# Altium footprint library standard.PcbLib: 330 footprints (part 21 of 21)
Each footprint in its own frame and in the unit in brackets; x right, y up, seen from the top. Pads: shape width x height; smd on the part's side, far side on the other; paste and mask are expansions set on the pad; w line width, h text height; cw(c..) or ccw(c..) is an arc to the next point about the centre after c.
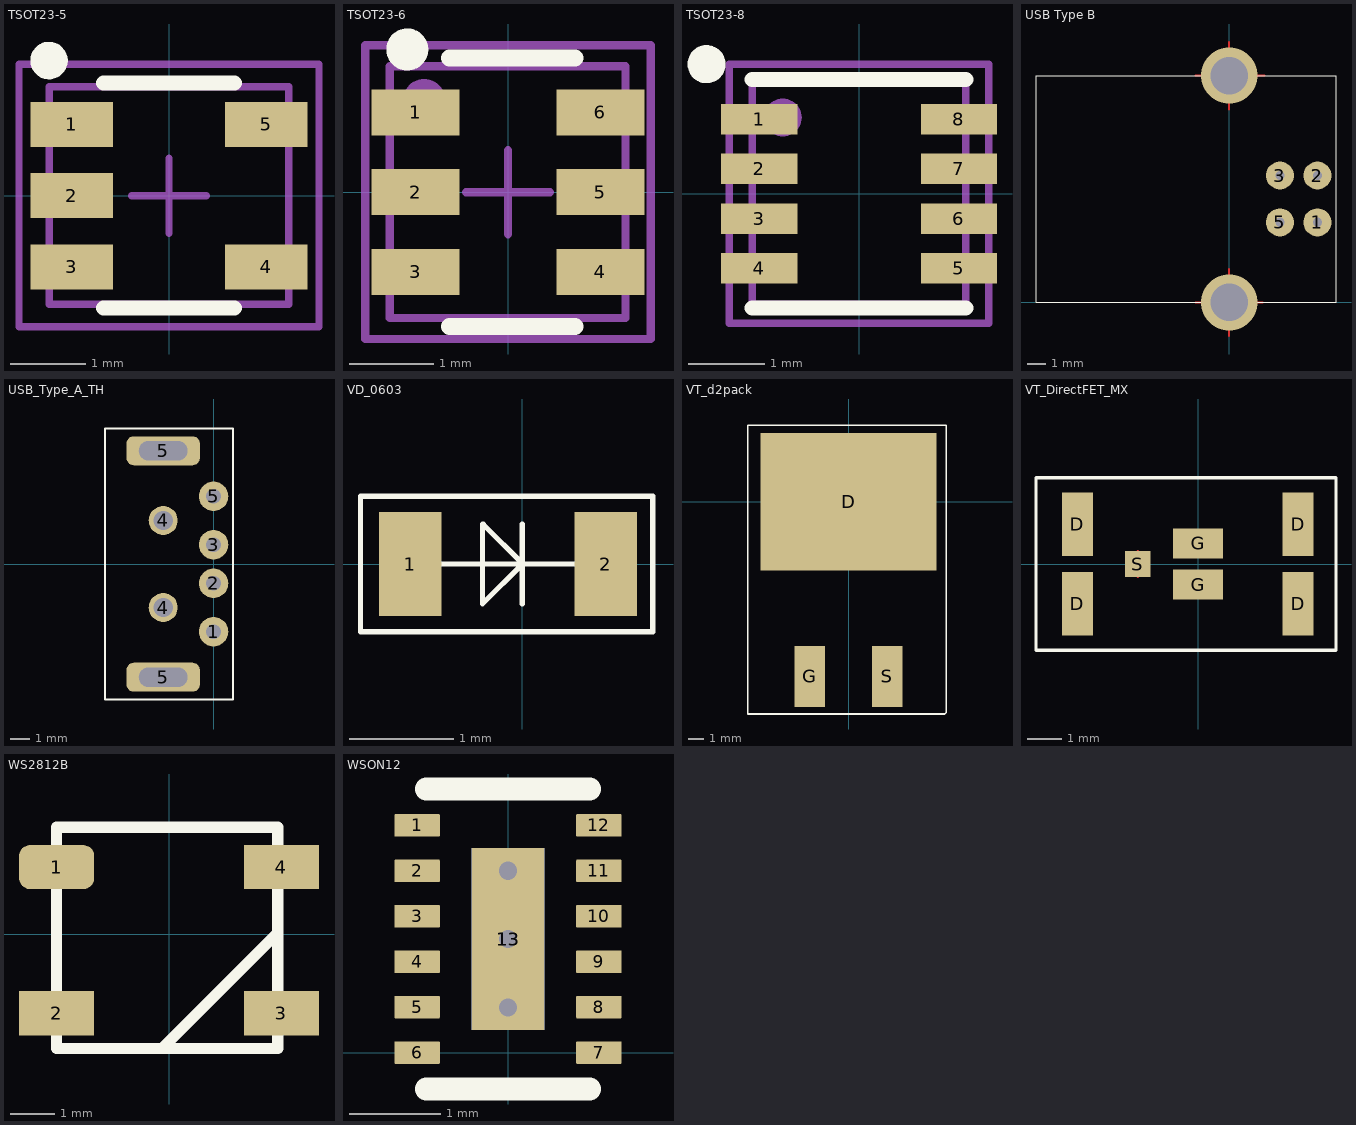
[diagram p20: the footprints below, top view; thin cyan lines are the x and y axes]

## TSOT23-5 [mm] "TSOT23, 5-Leads, Body 2,90x2,80mm, Pitch 0,95mm"
height 1.45
pads (6):
  rect 1.1x0.6 smd: 1(-1.3,0.95) 2(-1.3,0) 3(-1.3,-0.95) 4(1.3,-0.95) 5(1.3,0.95)
  round 0.5 on Mech1: ""(-1.2,1)
Top Overlay:
  circle w0.25: c-1.6,1.8 r0.125
  lines w0.2: -0.875,-1.5 0.875,-1.5 ; -0.875,1.5 0.875,1.5
Mechanical 1:
  lines w0.1: -1.595,-1.45 -1.595,1.45 1.595,1.45 1.595,-1.45 -1.595,-1.45
Mechanical 15:
  lines w0.1: -0.5,0 0.5,0 ; 0,-0.5 0,0.5 ; -2,-1.75 -2,1.75 2,1.75 2,-1.75 -2,-1.75
3D body "TSOT23-5.STEP": height 0.94, standoff -0.02, extent -1.595,-1.45 1.595,1.45

## TSOT23-6 [mm] "TSOT23, 6-Leads, Body 2,90x1,75mm, Pitch 0,9mm"
height 1
pads (7):
  rect 1.05x0.55 smd: 1(-1.1,0.95) 2(-1.1,0) 3(-1.1,-0.95) 4(1.1,-0.95) 5(1.1,0) 6(1.1,0.95)
  round 0.5 on Mech1: ""(-1,1.1)
Top Overlay:
  circle w0.25: c-1.2,1.7 r0.125
  lines w0.2: -0.7,-1.6 0.8,-1.6 ; -0.7,1.6 0.8,1.6
Mechanical 1:
  lines w0.1: -1.41,-1.5 1.4,-1.5 1.4,1.5 -1.41,1.5 -1.41,-1.5
Mechanical 15:
  lines w0.1: -0.5,0 0.5,0 ; 0,-0.5 0,0.5 ; -1.7,-1.75 1.7,-1.75 1.7,1.75 -1.7,1.75 -1.7,-1.75
3D body "TSOT23-6.STEP": height 0.86, standoff 0, extent -1.41,-1.5 1.4,1.5

## TSOT23-8 [mm]
height 1
pads (9):
  rect 1x0.4 smd: 1(-1.31,0.975) 2(-1.31,0.325) 3(-1.31,-0.325) 4(-1.31,-0.975) 5(1.31,-0.975) 6(1.31,-0.325) 7(1.31,0.325) 8(1.31,0.975)
  round 0.5 on Mech1: ""(-1,1)
Top Overlay:
  circle w0.25: c-2,1.7 r0.125
  lines w0.2: -1.4,-1.5 1.4,-1.5 ; -1.4,1.5 1.4,1.5
Mechanical 1:
  lines w0.1: -1.4,-1.45 -1.4,1.45 1.4,1.45 1.4,-1.45 -1.4,-1.45
Mechanical 15:
  lines w0.1: -1.7,-1.7 1.7,-1.7 1.7,1.7 -1.7,1.7 -1.7,-1.7
3D body "TSOT23-8_2.STEP": height 1, standoff 0, extent -1.4,-1.45 1.4,1.45

## USB Type B [mm]
height 11.2
pads (5):
  round 1.5 hole 0.5: 1(4.71,4.27) 2(4.71,6.77) 3(2.71,6.77) 5(2.71,4.27)
  round 0 all layers, no hole: 4(0,0)
via 0,0 diameter 3 hole 2
via 0,12.1 diameter 3 hole 2
Top Layer:
  lines w0.1: -1.8,0 1.8,0 ; -1.8,12.1 -0.875,12.1 0.975,12.1 1.9,12.1 ; 0,-1.8 0,-0.413 0,0.262 0,1.8 ; 0,10.3 0,11.688 0,12.363 0,13.9
Top Overlay:
  lines w0.05: -10.3,0 -10.3,12.1 5.7,12.1 5.7,0 -10.3,0
3D body "User Library-JST_UBB-4R-D14T-4D.step": height 11, standoff -3.72, extent -10.35,-1.948 5.95,12.95

## USB_Type_A_TH [mm]
height 4.25
pads (8):
  round 1.524 hole 0.762: 1(0,-3.5) 2(0,-1) 3(0,1) 5(0,3.5)
  round 1.5 hole 1: 4(-2.6,-2.25) 4(-2.6,2.25)
  rrect50% 3.8x1.5 hole 1 slot 2.5 at 0 deg: 5(-2.6,-5.85) 5(-2.6,5.85)
Top Overlay:
  lines w0.1: -5.6,-7 -5.6,7 1,7 1,-7 -5.6,-7

## VD_0603 [mm]
pads (2):
  rect 0.6x1 smd: 1(-1.075,0) 2(0.8,0)
Top Overlay:
  lines w0.05: -0.889,0 0.9,0 ; 0,-0.381 0,-0.191 0,0.191 0,0.381 ; -1.55,-0.65 1.25,-0.65 1.25,0.65 -1.55,0.65 -1.55,-0.65 ; -0.381,-0.381 0,0 0.006,0 -0.375,0.381 -0.381,0.381 -0.381,-0.381

## VT_d2pack [mm]
pads (3):
  rect 11.5x9 smd: D(0,0)
  rect 2x4 smd: G(-2.54,-11.43) S(2.54,-11.43)
Top Overlay:
  lines w0.1: -6.6,-13.9 6.3,-13.9 6.4,-13.8 6.4,5 -6.6,5 -6.6,-13.9

## VT_DirectFET_MX [mm]
pads (7):
  rect 0.9x1.85 smd: D(-3.5,-1.15) D(-3.5,1.15) D(2.9,-1.15) D(2.9,1.15)
  rect 1.45x0.87 smd: G(0,-0.6) G(0,0.6)
  rect 0.75x0.75 smd: S(-1.75,0)
Top Layer:
  lines w0.1: -1.75,-0.35 -1.75,0.35 ; 0,-0.6 0.25,-0.6 ; 0,0.6 0.3,0.6
Top Overlay:
  lines w0.1: -4.7,-2.5 4,-2.5 4,2.5 -4.7,2.5 -4.7,-2.5

## WS2812B [mm]
pads (4):
  rrect50% 1.7x1 smd: 1(-2.54,1.524)
  rect 1.7x1 smd: 2(-2.54,-1.778) 3(2.54,-1.778) 4(2.54,1.524)
Top Overlay:
  lines w0.254: -0.098,-2.518 2.44,0.019 ; -2.54,-2.576 2.46,-2.576 2.46,2.424 -2.54,2.424 -2.54,-2.576

## WSON12 [mm]
pads (14):
  rrect10% 0.5x0.25 smd: 1(-1,2.5) 2(-1,2) 3(-1,1.5) 4(-1,1) 5(-1,0.5) 6(-1,0) 7(1,0) 8(1,0.5) 9(1,1) 10(1,1.5) 11(1,2) 12(1,2.5)
  rrect1% 0.8x2 smd: 13(0,1.25)
  rrect1% 0.8x2 smd far side: 13(0,1.25)
via 0,1.25 diameter 0.3 hole 0.2
via 0,0.496 diameter 0.3 hole 0.2
via 0,2 diameter 0.3 hole 0.2
Top Overlay:
  lines w0.25: -0.9,-0.4 0.9,-0.4 ; -0.9,2.9 0.9,2.9
3D body "WSON12.x_t": height 0.88, standoff 0, extent -1.055,-0.305 1.055,2.805